# Altium footprint library Connectors THD.PcbLib: 631 footprints (part 31 of 46) (continued)
## PHOENIX_1777222 [mm] "PCB Header, 12A, 320V, Pitch: 5.08mm, 17 Positions, MSTBV Serie"
height 12
pads (19):
  round 2.1 hole 1.4: 1(-40.64,0) 2(-35.56,0) 3(-30.48,0) 4(-25.4,0) 5(-20.32,0) 6(-15.24,0) 7(-10.16,0) 8(-5.08,0) 9(0,0) 10(5.08,0) 11(10.16,0) 12(15.24,0) 13(20.32,0) 14(25.4,0) 15(30.48,0) 16(35.56,0) 17(40.64,0)
  round 3.8 hole 2.4: P1(-45.72,0) P2(45.72,0)
Top Overlay:
  drawing of 314 lines, arcs and shapes, not listed
  text "5" at -20.523,3.505 h0.75
  text "4" at -25.654,3.505 h0.75
  text "3" at -30.709,3.505 h0.75
  text "2" at -35.78,3.505 h0.75
  text "1" at -40.78,3.505 h0.75
  text "6" at -15.443,3.505 h0.75
  text "7" at -10.363,3.505 h0.75
  text "8" at -5.309,3.505 h0.75
  text "9" at -0.203,3.505 h0.75
  text "10" at 4.572,3.505 h0.75
  text "11" at 9.779,3.505 h0.75
  text "12" at 14.707,3.505 h0.75
  text "17" at 40.132,3.505 h0.75
  text "16" at 35.052,3.505 h0.75
  text "15" at 29.972,3.505 h0.75
  text "14" at 24.917,3.505 h0.75
  text "13" at 19.787,3.505 h0.75
Mechanical 8:
  lines w0.1: -46.22,0 -45.72,0 ; -45.72,-0.5 -45.72,0 ; -45.72,0.5 -45.72,0 ; -45.22,0 -45.72,0 ; -41.14,0 -40.64,0 ; -40.64,-0.5 -40.64,0 ; -40.64,0.5 -40.64,0 ; -40.14,0 -40.64,0 ; -36.06,0 -35.56,0 ; -35.56,-0.5 -35.56,0 ; -35.56,0.5 -35.56,0 ; -35.06,0 -35.56,0 ; -30.98,0 -30.48,0 ; -30.48,-0.5 -30.48,0 ; -30.48,0.5 -30.48,0 ; -29.98,0 -30.48,0 ; -25.9,0 -25.4,0 ; -25.4,-0.5 -25.4,0 ; -25.4,0.5 -25.4,0 ; -24.9,0 -25.4,0 ; -20.82,0 -20.32,0 ; -20.32,-0.5 -20.32,0 ; -20.32,0.5 -20.32,0 ; -19.82,0 -20.32,0 ; -15.74,0 -15.24,0 ; -15.24,-0.5 -15.24,0 ; -15.24,0.5 -15.24,0 ; -14.74,0 -15.24,0 ; -13.2,0 -12.7,0 ; -12.7,-0.5 -12.7,0 ; -12.7,0.5 -12.7,0 ; -12.2,0 -12.7,0 ; -10.66,0 -10.16,0 ; -10.16,-0.5 -10.16,0 ; -10.16,0.5 -10.16,0 ; -9.66,0 -10.16,0 ; -5.58,0 -5.08,0 ; -5.08,-0.5 -5.08,0 ; -5.08,0.5 -5.08,0 ; -4.58,0 -5.08,0 ; -0.5,0 0,0 ; 0,-0.5 0,0 ; 0,0.5 0,0 ; 0.5,0 0,0 ; 4.58,0 5.08,0 ; 5.08,-0.5 5.08,0 ; 5.08,0.5 5.08,0 ; 5.58,0 5.08,0 ; 9.66,0 10.16,0 ; 10.16,-0.5 10.16,0 ; 10.16,0.5 10.16,0 ; 10.66,0 10.16,0 ; 14.74,0 15.24,0 ; 15.24,-0.5 15.24,0 ; 15.24,0.5 15.24,0 ; 15.74,0 15.24,0 ; 19.82,0 20.32,0 ; 20.32,-0.5 20.32,0 ; 20.32,0.5 20.32,0 ; 20.82,0 20.32,0 ; 24.9,0 25.4,0 ; 25.4,-0.5 25.4,0 ; 25.4,0.5 25.4,0 ; 25.9,0 25.4,0 ; 29.98,0 30.48,0 ; 30.48,-0.5 30.48,0 ; 30.48,0.5 30.48,0 ; 30.98,0 30.48,0 ; 35.06,0 35.56,0 ; 35.56,-0.5 35.56,0 ; 35.56,0.5 35.56,0 ; 36.06,0 35.56,0 ; 40.14,0 40.64,0 ; 40.64,-0.5 40.64,0 ; 40.64,0.5 40.64,0 ; 41.14,0 40.64,0 ; 45.22,0 45.72,0 ; 45.72,-0.5 45.72,0 ; 45.72,0.5 45.72,0 ; 46.22,0 45.72,0
Mechanical 14:
  drawing of 538 lines, arcs and shapes, not listed
  text "13" at 19.787,3.505 h0.75
  text "14" at 24.917,3.505 h0.75
  text "15" at 29.972,3.505 h0.75
  text "16" at 35.052,3.505 h0.75
  text "17" at 40.132,3.505 h0.75
  text "12" at 14.707,3.505 h0.75
  text "11" at 9.779,3.505 h0.75
  text "10" at 4.572,3.505 h0.75
  text "9" at -0.203,3.505 h0.75
  text "8" at -5.309,3.505 h0.75
  text "7" at -10.363,3.505 h0.75
  text "6" at -15.443,3.505 h0.75
  text "1" at -40.78,3.505 h0.75
  text "2" at -35.78,3.505 h0.75
  text "3" at -30.709,3.505 h0.75
  text "4" at -25.654,3.505 h0.75
  text "5" at -20.523,3.505 h0.75
3D body: height 12, standoff -3.9, extent -48.26,-3.8 48.26,4.8

## PHOENIX_1777251 [mm] "PCB Header, 12A, 320V, Pitch: 5.08mm, 20 Positions, MSTBV Serie"
height 12
pads (22):
  round 2.1 hole 1.4: 1(-48.26,0) 2(-43.18,0) 3(-38.1,0) 4(-33.02,0) 5(-27.94,0) 6(-22.86,0) 7(-17.78,0) 8(-12.7,0) 9(-7.62,0) 10(-2.54,0) 11(2.54,0) 12(7.62,0) 13(12.7,0) 14(17.78,0) 15(22.86,0) 16(27.94,0) 17(33.02,0) 18(38.1,0) 19(43.18,0) 20(48.26,0)
  round 3.8 hole 2.4: P1(-53.34,0) P2(53.34,0)
Top Overlay:
  drawing of 368 lines, arcs and shapes, not listed
  text "20" at 47.701,3.505 h0.75
  text "19" at 42.672,3.505 h0.75
  text "18" at 37.567,3.505 h0.75
  text "5" at -28.143,3.505 h0.75
  text "4" at -33.274,3.505 h0.75
  text "3" at -38.329,3.505 h0.75
  text "2" at -43.4,3.505 h0.75
  text "1" at -48.4,3.505 h0.75
  text "6" at -23.063,3.505 h0.75
  text "7" at -17.983,3.505 h0.75
  text "8" at -12.929,3.505 h0.75
  text "9" at -7.823,3.505 h0.75
  text "10" at -3.048,3.505 h0.75
  text "11" at 2.159,3.505 h0.75
  text "12" at 7.087,3.505 h0.75
  text "17" at 32.512,3.505 h0.75
  text "16" at 27.432,3.505 h0.75
  text "15" at 22.352,3.505 h0.75
  text "14" at 17.297,3.505 h0.75
  text "13" at 12.167,3.505 h0.75
Mechanical 8:
  lines w0.1: -53.84,0 -53.34,0 ; -53.34,-0.5 -53.34,0 ; -53.34,0.5 -53.34,0 ; -52.84,0 -53.34,0 ; -48.76,0 -48.26,0 ; -48.26,-0.5 -48.26,0 ; -48.26,0.5 -48.26,0 ; -47.76,0 -48.26,0 ; -43.68,0 -43.18,0 ; -43.18,-0.5 -43.18,0 ; -43.18,0.5 -43.18,0 ; -42.68,0 -43.18,0 ; -38.6,0 -38.1,0 ; -38.1,-0.5 -38.1,0 ; -38.1,0.5 -38.1,0 ; -37.6,0 -38.1,0 ; -33.52,0 -33.02,0 ; -33.02,-0.5 -33.02,0 ; -33.02,0.5 -33.02,0 ; -32.52,0 -33.02,0 ; -28.44,0 -27.94,0 ; -27.94,-0.5 -27.94,0 ; -27.94,0.5 -27.94,0 ; -27.44,0 -27.94,0 ; -23.36,0 -22.86,0 ; -22.86,-0.5 -22.86,0 ; -22.86,0.5 -22.86,0 ; -22.36,0 -22.86,0 ; -20.82,0 -20.32,0 ; -20.32,-0.5 -20.32,0 ; -20.32,0.5 -20.32,0 ; -19.82,0 -20.32,0 ; -18.28,0 -17.78,0 ; -17.78,-0.5 -17.78,0 ; -17.78,0.5 -17.78,0 ; -17.28,0 -17.78,0 ; -13.2,0 -12.7,0 ; -12.7,-0.5 -12.7,0 ; -12.7,0.5 -12.7,0 ; -12.2,0 -12.7,0 ; -8.12,0 -7.62,0 ; -7.62,-0.5 -7.62,0 ; -7.62,0.5 -7.62,0 ; -7.12,0 -7.62,0 ; -3.04,0 -2.54,0 ; -2.54,-0.5 -2.54,0 ; -2.54,0.5 -2.54,0 ; -2.04,0 -2.54,0 ; 2.04,0 2.54,0 ; 2.54,-0.5 2.54,0 ; 2.54,0.5 2.54,0 ; 3.04,0 2.54,0 ; 7.12,0 7.62,0 ; 7.62,-0.5 7.62,0 ; 7.62,0.5 7.62,0 ; 8.12,0 7.62,0 ; 12.2,0 12.7,0 ; 12.7,-0.5 12.7,0 ; 12.7,0.5 12.7,0 ; 13.2,0 12.7,0 ; 17.28,0 17.78,0 ; 17.78,-0.5 17.78,0 ; 17.78,0.5 17.78,0 ; 18.28,0 17.78,0 ; 22.36,0 22.86,0 ; 22.86,-0.5 22.86,0 ; 22.86,0.5 22.86,0 ; 23.36,0 22.86,0 ; 27.44,0 27.94,0 ; 27.94,-0.5 27.94,0 ; 27.94,0.5 27.94,0 ; 28.44,0 27.94,0 ; 32.52,0 33.02,0 ; 33.02,-0.5 33.02,0 ; 33.02,0.5 33.02,0 ; 33.52,0 33.02,0 ; 37.6,0 38.1,0 ; 38.1,-0.5 38.1,0 ; 38.1,0.5 38.1,0 ; 38.6,0 38.1,0 ; 42.68,0 43.18,0 ; 43.18,-0.5 43.18,0 ; 43.18,0.5 43.18,0 ; 43.68,0 43.18,0 ; 47.76,0 48.26,0 ; 48.26,-0.5 48.26,0 ; 48.26,0.5 48.26,0 ; 48.76,0 48.26,0 ; 52.84,0 53.34,0 ; 53.34,-0.5 53.34,0 ; 53.34,0.5 53.34,0 ; 53.84,0 53.34,0
Mechanical 14:
  drawing of 631 lines, arcs and shapes, not listed
  text "13" at 12.167,3.505 h0.75
  text "14" at 17.297,3.505 h0.75
  text "15" at 22.352,3.505 h0.75
  text "16" at 27.432,3.505 h0.75
  text "17" at 32.512,3.505 h0.75
  text "12" at 7.087,3.505 h0.75
  text "11" at 2.159,3.505 h0.75
  text "10" at -3.048,3.505 h0.75
  text "9" at -7.823,3.505 h0.75
  text "8" at -12.929,3.505 h0.75
  text "7" at -17.983,3.505 h0.75
  text "6" at -23.063,3.505 h0.75
  text "1" at -48.4,3.505 h0.75
  text "2" at -43.4,3.505 h0.75
  text "3" at -38.329,3.505 h0.75
  text "4" at -33.274,3.505 h0.75
  text "5" at -28.143,3.505 h0.75
  text "18" at 37.567,3.505 h0.75
  text "19" at 42.672,3.505 h0.75
  text "20" at 47.701,3.505 h0.75
3D body: height 12, standoff -3.9, extent -55.88,-3.8 55.88,4.8

## PHOENIX_1785968 [mm] "PCB Header, 12A, 320V, Pitch: 5.08mm, 4 Positions, ICV Serie"
height 19
pads (8):
  round 2.1 hole 1.4: 1(-7.62,-2.54) 1(-7.62,2.54) 2(-2.54,-2.54) 2(-2.54,2.54) 3(2.54,-2.54) 3(2.54,2.54) 4(7.62,-2.54) 4(7.62,2.54)
Top Overlay:
  circle w0.2: c-7.62,0.015 r0.7
  circle w0.2: c-2.54,0.015 r0.7
  circle w0.2: c2.54,0.015 r0.7
  circle w0.2: c7.62,0.015 r0.7
  lines w0.2: -11.16,-4.1 -6.68,-4.1 -6.68,-6.3 -5.08,-6.3 -5.08,-4.1 5.08,-4.1 5.08,-6.3 6.68,-6.3 6.68,-4.1 11.16,-4.1 ; -11.16,-2.136 -10.16,-2.5 ; -11.16,2.136 -10.16,2.5 -10.16,-2.9 -9.025,-2.9 ; -10.16,-4.4 -10.16,-4.65 -9.32,-4.65 -9.32,-4.4 ; -10.16,2.015 -9.741,2.015 cw(c-7.62,0.015) -9.07,2.544 ; -8.281,1.249 ccw(c-7.62,0.015) -8.32,1.227 -8.32,-1.197 ccw(c-7.62,0.015) -8.251,-1.235 ; -6.989,-1.235 ccw(c-7.62,0.015) -6.959,1.249 ; -6.92,-4.412 -6.92,-4.65 -6.68,-4.65 ; -6.68,-4.4 -11.16,-4.4 -11.16,3.9 11.16,3.9 11.16,-4.4 6.68,-4.4 ; -6.215,-2.9 -3.945,-2.9 ; -6.17,2.544 cw(c-7.62,0.015) -5.499,2.015 -4.661,2.015 cw(c-2.54,0.015) -3.99,2.544 ; -5.08,-4.65 -4.24,-4.65 -4.24,-4.4 ; -5.08,-4.4 5.08,-4.4 ; -3.201,1.249 ccw(c-2.54,0.015) -3.171,-1.235 ; -1.909,-1.235 ccw(c-2.54,0.015) -1.879,1.249 ; -1.84,-4.4 -1.84,-4.65 0.84,-4.65 0.84,-4.4 ; -1.135,-2.9 1.135,-2.9 ; -1.09,2.544 cw(c-2.54,0.015) -0.419,2.015 0.419,2.015 cw(c2.54,0.015) 1.09,2.544 ; 1.879,1.249 ccw(c2.54,0.015) 1.909,-1.235 ; 3.171,-1.235 ccw(c2.54,0.015) 3.201,1.249 ; 3.24,-4.4 3.24,-4.65 5.08,-4.65 ; 3.945,-2.9 6.215,-2.9 ; 3.99,2.544 cw(c2.54,0.015) 4.661,2.015 5.499,2.015 cw(c7.62,0.015) 6.17,2.544 ; 6.959,1.249 ccw(c7.62,0.015) 6.989,-1.235 ; 8.251,-1.235 ccw(c7.62,0.015) 8.281,1.249 ; 8.32,-4.414 8.32,-4.65 10.16,-4.65 10.16,-4.4 ; 9.025,-2.9 10.16,-2.9 10.16,2.5 11.16,2.136 ; 9.07,2.544 cw(c7.62,0.015) 9.741,2.015 10.16,2.015 ; 10.16,-2.5 11.16,-2.136 ; -5.281,-0.735 -5.08,0.015 -4.879,-0.735 -5.281,-0.735 ; -0.201,-0.735 0,0 0.201,-0.735 -0.201,-0.735 ; 4.879,-0.735 5.08,0.015 5.281,-0.735 4.879,-0.735
  text "4" at 7.266,-6.18 h1
  text "1" at -7.735,-6.18 h1
  text "1" at -9.46,-0.58 h1
Mechanical 8:
  lines w0.1: -8.12,-2.54 -7.62,-2.54 ; -8.12,2.54 -7.62,2.54 ; -7.62,-3.04 -7.62,-2.54 ; -7.62,-2.04 -7.62,-2.54 ; -7.62,2.04 -7.62,2.54 ; -7.62,3.04 -7.62,2.54 ; -7.12,-2.54 -7.62,-2.54 ; -7.12,2.54 -7.62,2.54 ; -3.04,-2.54 -2.54,-2.54 ; -3.04,2.54 -2.54,2.54 ; -2.54,-3.04 -2.54,-2.54 ; -2.54,-2.04 -2.54,-2.54 ; -2.54,2.04 -2.54,2.54 ; -2.54,3.04 -2.54,2.54 ; -2.04,-2.54 -2.54,-2.54 ; -2.04,2.54 -2.54,2.54 ; -0.5,0 0,0 ; 0,-0.5 0,0 ; 0,0.5 0,0 ; 0.5,0 0,0 ; 2.04,-2.54 2.54,-2.54 ; 2.04,2.54 2.54,2.54 ; 2.54,-3.04 2.54,-2.54 ; 2.54,-2.04 2.54,-2.54 ; 2.54,2.04 2.54,2.54 ; 2.54,3.04 2.54,2.54 ; 3.04,-2.54 2.54,-2.54 ; 3.04,2.54 2.54,2.54 ; 7.12,-2.54 7.62,-2.54 ; 7.12,2.54 7.62,2.54 ; 7.62,-3.04 7.62,-2.54 ; 7.62,-2.04 7.62,-2.54 ; 7.62,2.04 7.62,2.54 ; 7.62,3.04 7.62,2.54 ; 8.12,-2.54 7.62,-2.54 ; 8.12,2.54 7.62,2.54
Mechanical 14:
  circle w0.1: c-7.62,0.015 r0.7
  circle w0.1: c-2.54,0.015 r0.7
  circle w0.1: c-2.54,0.015 r1.4
  circle w0.1: c2.54,0.015 r0.7
  circle w0.1: c2.54,0.015 r1.4
  circle w0.1: c7.62,0.015 r0.7
  circle w0.1: c7.62,0.015 r1.4
  lines w0.1: -11.16,-4.1 -6.68,-4.1 -6.68,-6.3 -5.08,-6.3 -5.08,-4.1 5.08,-4.1 5.08,-6.3 6.68,-6.3 6.68,-4.1 11.16,-4.1 ; -11.16,-2.136 -10.16,-2.5 ; -11.16,2.136 -10.16,2.5 -10.16,-2.9 -8.875,-2.9 -9.11,-2.22 -6.13,-2.22 -6.365,-2.9 -3.795,-2.9 -4.03,-2.22 -1.05,-2.22 -1.285,-2.9 1.285,-2.9 1.05,-2.22 4.03,-2.22 3.795,-2.9 6.365,-2.9 6.13,-2.22 9.11,-2.22 8.875,-2.9 10.16,-2.9 10.16,2.5 11.16,2.136 ; -10.16,-4.4 -10.16,-4.65 -9.32,-4.65 -9.32,-4.4 ; -10.16,2.015 -9.741,2.015 cw(c-7.62,0.015) -5.499,2.015 -4.661,2.015 cw(c-2.54,0.015) -0.419,2.015 0.419,2.015 cw(c2.54,0.015) 4.661,2.015 5.499,2.015 cw(c7.62,0.015) 9.741,2.015 10.16,2.015 ; -6.92,-4.412 -6.92,-4.65 -6.68,-4.65 ; -6.68,-4.4 -11.16,-4.4 -11.16,3.9 11.16,3.9 11.16,-4.4 6.68,-4.4 ; -5.08,-4.65 -4.24,-4.65 -4.24,-4.4 ; -5.08,-4.4 5.08,-4.4 ; -1.84,-4.4 -1.84,-4.65 0.84,-4.65 0.84,-4.4 ; 3.24,-4.4 3.24,-4.65 5.08,-4.65 ; 8.32,-4.414 8.32,-4.65 10.16,-4.65 10.16,-4.4 ; 10.16,-2.5 11.16,-2.136 ; -8.32,-1.197 ccw(c-7.62,0.015) -8.32,1.227 -8.32,-1.197 ; -5.281,-0.735 -5.08,0.015 -4.879,-0.735 -5.281,-0.735 ; -0.201,-0.735 0,0 0.201,-0.735 -0.201,-0.735 ; 4.879,-0.735 5.08,0.015 5.281,-0.735 4.879,-0.735
  text "4" at 7.266,-6.18 h1
  text "1" at -7.735,-6.18 h1
  text "1" at -9.46,-0.58 h1
3D body: height 19, standoff -3.6, extent -11.16,-6.3 11.16,3.9

## PHOENIX_1803426 [mm] "PCB Header, 8A, 160 V, Pitch: 3.81mm, 2 Positions, MCV Serie"
height 9.2
pads (2):
  round 1.9 hole 1.2: 1(-1.905,0) 2(1.905,0)
Top Overlay:
  lines w0.2: -4.505,4 4.505,4 ; -3.61,-2.3 -2.805,-2.3 ; -3.61,2 -2.305,2 -2.305,2.47 ccw(c-2.505,2.47) -2.505,2.67 ; -3.608,3.9 -3.609,3.9 ; -3.608,4 -3.609,4 -3.609,3.9 ; -2.305,2.134 -3.61,2.134 -3.61,-2.434 -2.759,-2.434 ; -1.505,2.134 -0.2,2.134 -0.2,-2.434 -1.051,-2.434 ; -1.305,2.67 ccw(c-1.305,2.47) -1.505,2.47 -1.505,2 -0.2,2 ; -0.201,4 -0.2,4 -0.2,3.9 -0.201,3.9 -3.609,3.9 ; -0.2,-2.3 -1.005,-2.3 ; 0.2,-2.3 1.005,-2.3 ; 0.2,2 1.505,2 1.505,2.47 ccw(c1.305,2.47) 1.305,2.67 ; 0.202,3.9 0.201,3.9 ; 0.202,4 0.201,4 0.201,3.9 ; 1.505,2.134 0.2,2.134 0.2,-2.434 1.051,-2.434 ; 2.305,2.134 3.61,2.134 3.61,-2.434 2.759,-2.434 ; 2.505,2.67 ccw(c2.505,2.47) 2.305,2.47 2.305,2 3.61,2 ; 3.609,4 3.61,4 3.61,3.9 3.609,3.9 0.201,3.9 ; 3.61,-2.3 2.805,-2.3 ; -2.805,-2.3 cw(c-1.905,-3.5) -1.005,-2.3 ; -2.805,-2.3 -2.794,-2.334 -2.782,-2.367 ccw(c5.266,0.384) -2.759,-2.434 ; -2.759,-2.434 cw(c-1.905,-3.5) -1.051,-2.434 ; -1.051,-2.434 -1.039,-2.401 -1.028,-2.367 ccw(c-9.737,0.61) -1.005,-2.3 ; 1.005,-2.3 cw(c1.905,-3.5) 2.805,-2.3 ; 1.005,-2.3 1.016,-2.334 1.028,-2.367 ccw(c9.076,0.384) 1.051,-2.434 ; 1.051,-2.434 cw(c1.905,-3.5) 2.759,-2.434 ; 2.759,-2.434 2.771,-2.401 2.782,-2.367 ccw(c-5.927,0.61) 2.805,-2.3 ; -4.505,-3 4.505,-3 4.505,4.25 -4.505,4.25 -4.505,-3 ; -3.395,3.35 -0.415,3.35 -0.65,2.67 -3.16,2.67 -3.395,3.35 ; -0.188,-0.7 0.188,-0.7 0,0 -0.188,-0.7 ; 0.415,3.35 3.395,3.35 3.16,2.67 0.65,2.67 0.415,3.35
  text "1" at -2.18,4.6 h1
  text "2" at 1.63,4.6 h1
Mechanical 8:
  lines w0.1: -2.405,0 -1.905,0 ; -1.905,-0.5 -1.905,0 ; -1.905,0.5 -1.905,0 ; -1.405,0 -1.905,0 ; -0.5,0 0,0 ; 0,-0.5 0,0 ; 0,0.5 0,0 ; 0.5,0 0,0 ; 1.405,0 1.905,0 ; 1.905,-0.5 1.905,0 ; 1.905,0.5 1.905,0 ; 2.405,0 1.905,0
Mechanical 14:
  lines w0.1: -4.505,4 4.505,4 ; -3.61,-2.3 -2.805,-2.3 ; -3.61,2 -2.305,2 -2.305,2.47 ccw(c-2.505,2.47) -2.505,2.67 ; -3.608,3.9 -3.609,3.9 ; -3.608,4 -3.609,4 -3.609,3.9 ; -2.305,2.134 -3.61,2.134 -3.61,-2.434 -2.759,-2.434 ; -1.505,2.134 -0.2,2.134 -0.2,-2.434 -1.051,-2.434 ; -1.305,2.67 ccw(c-1.305,2.47) -1.505,2.47 -1.505,2 -0.2,2 ; -0.201,4 -0.2,4 -0.2,3.9 -0.201,3.9 -3.609,3.9 ; -0.2,-2.3 -1.005,-2.3 ; 0.2,-2.3 1.005,-2.3 ; 0.2,2 1.505,2 1.505,2.47 ccw(c1.305,2.47) 1.305,2.67 ; 0.202,3.9 0.201,3.9 ; 0.202,4 0.201,4 0.201,3.9 ; 1.505,2.134 0.2,2.134 0.2,-2.434 1.051,-2.434 ; 2.305,2.134 3.61,2.134 3.61,-2.434 2.759,-2.434 ; 2.505,2.67 ccw(c2.505,2.47) 2.305,2.47 2.305,2 3.61,2 ; 3.609,4 3.61,4 3.61,3.9 3.609,3.9 0.201,3.9 ; 3.61,-2.3 2.805,-2.3 ; -2.805,-2.3 cw(c-1.905,-3.5) -1.005,-2.3 ; -2.805,-2.3 -2.794,-2.334 -2.782,-2.367 ccw(c5.266,0.384) -2.759,-2.434 ; -2.759,-2.434 cw(c-1.905,-3.5) -1.051,-2.434 ; -1.051,-2.434 -1.039,-2.401 -1.028,-2.367 ccw(c-9.737,0.61) -1.005,-2.3 ; 1.005,-2.3 cw(c1.905,-3.5) 2.805,-2.3 ; 1.005,-2.3 1.016,-2.334 1.028,-2.367 ccw(c9.076,0.384) 1.051,-2.434 ; 1.051,-2.434 cw(c1.905,-3.5) 2.759,-2.434 ; 2.759,-2.434 2.771,-2.401 2.782,-2.367 ccw(c-5.927,0.61) 2.805,-2.3 ; -4.505,-3 4.505,-3 4.505,4.25 -4.505,4.25 -4.505,-3 ; -3.395,3.35 -0.415,3.35 -0.65,2.67 -3.16,2.67 -3.395,3.35 ; -2.405,-0.625 ccw(c-1.905,0) -2.405,0.625 -2.405,-0.624 ; -2.305,-0.4 -2.305,0.4 -1.505,0.4 -1.505,-0.4 -2.305,-0.4 ; -0.188,-0.7 0.188,-0.7 0,0 -0.188,-0.7 ; 0.415,3.35 3.395,3.35 3.16,2.67 0.65,2.67 0.415,3.35 ; 1.405,-0.625 ccw(c1.905,0) 1.405,0.625 1.405,-0.624 ; 1.505,-0.4 1.505,0.4 2.305,0.4 2.305,-0.4 1.505,-0.4
3D body: height 9.2, standoff -3.4, extent -4.505,-3 4.505,4.25

## PHOENIX_1803439 [mm] "PCB Header, 8A, 160 V, Pitch: 3.81mm, 3 Positions, MCV Serie"
height 9.2
pads (3):
  round 1.9 hole 1.2: 1(-3.81,0) 2(0,0) 3(3.81,0)
Top Overlay:
  lines w0.2: -6.41,4 6.41,4 ; -5.515,-2.3 -4.71,-2.3 ; -5.515,2 -4.21,2 -4.21,2.47 ccw(c-4.41,2.47) -4.41,2.67 ; -5.513,3.9 -5.514,3.9 ; -5.513,4 -5.514,4 -5.514,3.9 ; -4.21,2.134 -5.515,2.134 -5.515,-2.434 -4.664,-2.434 ; -3.41,2.134 -2.105,2.134 -2.105,-2.434 -2.956,-2.434 ; -3.21,2.67 ccw(c-3.21,2.47) -3.41,2.47 -3.41,2 -2.105,2 ; -2.106,4 -2.105,4 -2.105,3.9 -2.106,3.9 -5.514,3.9 ; -2.105,-2.3 -2.91,-2.3 ; -1.705,-2.3 -0.9,-2.3 ; -1.705,2 -0.4,2 -0.4,2.47 ccw(c-0.6,2.47) -0.6,2.67 ; -1.703,3.9 -1.704,3.9 ; -1.703,4 -1.704,4 -1.704,3.9 ; -0.4,2.134 -1.705,2.134 -1.705,-2.434 -0.854,-2.434 ; 0.4,2.134 1.705,2.134 1.705,-2.434 0.854,-2.434 ; 0.6,2.67 ccw(c0.6,2.47) 0.4,2.47 0.4,2 1.705,2 ; 1.704,4 1.705,4 1.705,3.9 1.704,3.9 -1.704,3.9 ; 1.705,-2.3 0.9,-2.3 ; 2.105,-2.3 2.91,-2.3 ; 2.105,2 3.41,2 3.41,2.47 ccw(c3.21,2.47) 3.21,2.67 ; 2.107,3.9 2.106,3.9 ; 2.107,4 2.106,4 2.106,3.9 ; 3.41,2.134 2.105,2.134 2.105,-2.434 2.956,-2.434 ; 4.21,2.134 5.515,2.134 5.515,-2.434 4.664,-2.434 ; 4.41,2.67 ccw(c4.41,2.47) 4.21,2.47 4.21,2 5.515,2 ; 5.514,4 5.515,4 5.515,3.9 5.514,3.9 2.106,3.9 ; 5.515,-2.3 4.71,-2.3 ; -4.71,-2.3 cw(c-3.81,-3.5) -2.91,-2.3 ; -4.71,-2.3 -4.699,-2.334 -4.687,-2.367 ccw(c3.361,0.384) -4.664,-2.434 ; -4.664,-2.434 cw(c-3.81,-3.5) -2.956,-2.434 ; -2.956,-2.434 -2.944,-2.401 -2.933,-2.367 ccw(c-11.642,0.61) -2.91,-2.3 ; -0.9,-2.3 cw(c0,-3.5) 0.9,-2.3 ; -0.9,-2.3 -0.889,-2.334 -0.877,-2.367 ccw(c7.171,0.384) -0.854,-2.434 ; -0.854,-2.434 cw(c0,-3.5) 0.854,-2.434 ; 0.854,-2.434 0.866,-2.401 0.877,-2.367 ccw(c-7.832,0.61) 0.9,-2.3 ; 2.91,-2.3 cw(c3.81,-3.5) 4.71,-2.3 ; 2.91,-2.3 2.921,-2.334 2.933,-2.367 ccw(c10.981,0.384) 2.956,-2.434 ; 2.956,-2.434 cw(c3.81,-3.5) 4.664,-2.434 ; 4.664,-2.434 4.676,-2.401 4.687,-2.367 ccw(c-4.022,0.61) 4.71,-2.3 ; -6.41,-3 -6.41,4.25 6.41,4.25 6.41,-3 -6.41,-3 ; -5.3,3.35 -5.065,2.67 -2.555,2.67 -2.32,3.35 -5.3,3.35 ; -2.093,-0.7 -1.905,0 -1.717,-0.7 -2.093,-0.7 ; -1.49,3.35 -1.255,2.67 1.255,2.67 1.49,3.35 -1.49,3.35 ; 1.717,-0.7 1.905,0 2.093,-0.7 1.717,-0.7 ; 2.32,3.35 2.555,2.67 5.065,2.67 5.3,3.35 2.32,3.35
  text "1" at -4.085,4.6 h1
  text "2" at -0.275,4.6 h1
  text "3" at 3.535,4.6 h1
Mechanical 2:
  circle w0.1: c3.81,0 r0.8
  circle w0.1: c0,0 r0.8
Mechanical 8:
  lines w0.1: -4.31,0 -3.81,0 ; -3.81,-0.5 -3.81,0 ; -3.81,0.5 -3.81,0 ; -3.31,0 -3.81,0 ; -0.5,0 0,0 ; 0,-0.5 0,0 ; 0,0.5 0,0 ; 0.5,0 0,0 ; 3.31,0 3.81,0 ; 3.81,-0.5 3.81,0 ; 3.81,0.5 3.81,0 ; 4.31,0 3.81,0
Mechanical 14:
  lines w0.1: -6.41,4 6.41,4 ; -5.515,-2.3 -4.71,-2.3 ; -5.515,2 -4.21,2 -4.21,2.47 ccw(c-4.41,2.47) -4.41,2.67 ; -5.513,3.9 -5.514,3.9 ; -5.513,4 -5.514,4 -5.514,3.9 ; -4.21,2.134 -5.515,2.134 -5.515,-2.434 -4.664,-2.434 ; -3.41,2.134 -2.105,2.134 -2.105,-2.434 -2.956,-2.434 ; -3.21,2.67 ccw(c-3.21,2.47) -3.41,2.47 -3.41,2 -2.105,2 ; -2.106,4 -2.105,4 -2.105,3.9 -2.106,3.9 -5.514,3.9 ; -2.105,-2.3 -2.91,-2.3 ; -1.705,-2.3 -0.9,-2.3 ; -1.705,2 -0.4,2 -0.4,2.47 ccw(c-0.6,2.47) -0.6,2.67 ; -1.703,3.9 -1.704,3.9 ; -1.703,4 -1.704,4 -1.704,3.9 ; -0.4,2.134 -1.705,2.134 -1.705,-2.434 -0.854,-2.434 ; 0.4,2.134 1.705,2.134 1.705,-2.434 0.854,-2.434 ; 0.6,2.67 ccw(c0.6,2.47) 0.4,2.47 0.4,2 1.705,2 ; 1.704,4 1.705,4 1.705,3.9 1.704,3.9 -1.704,3.9 ; 1.705,-2.3 0.9,-2.3 ; 2.105,-2.3 2.91,-2.3 ; 2.105,2 3.41,2 3.41,2.47 ccw(c3.21,2.47) 3.21,2.67 ; 2.107,3.9 2.106,3.9 ; 2.107,4 2.106,4 2.106,3.9 ; 3.41,2.134 2.105,2.134 2.105,-2.434 2.956,-2.434 ; 4.21,2.134 5.515,2.134 5.515,-2.434 4.664,-2.434 ; 4.41,2.67 ccw(c4.41,2.47) 4.21,2.47 4.21,2 5.515,2 ; 5.514,4 5.515,4 5.515,3.9 5.514,3.9 2.106,3.9 ; 5.515,-2.3 4.71,-2.3 ; -4.71,-2.3 cw(c-3.81,-3.5) -2.91,-2.3 ; -4.71,-2.3 -4.699,-2.334 -4.687,-2.367 ccw(c3.361,0.384) -4.664,-2.434 ; -4.664,-2.434 cw(c-3.81,-3.5) -2.956,-2.434 ; -2.956,-2.434 -2.944,-2.401 -2.933,-2.367 ccw(c-11.642,0.61) -2.91,-2.3 ; -0.9,-2.3 cw(c0,-3.5) 0.9,-2.3 ; -0.9,-2.3 -0.889,-2.334 -0.877,-2.367 ccw(c7.171,0.384) -0.854,-2.434 ; -0.854,-2.434 cw(c0,-3.5) 0.854,-2.434 ; 0.854,-2.434 0.866,-2.401 0.877,-2.367 ccw(c-7.832,0.61) 0.9,-2.3 ; 2.91,-2.3 cw(c3.81,-3.5) 4.71,-2.3 ; 2.91,-2.3 2.921,-2.334 2.933,-2.367 ccw(c10.981,0.384) 2.956,-2.434 ; 2.956,-2.434 cw(c3.81,-3.5) 4.664,-2.434 ; 4.664,-2.434 4.676,-2.401 4.687,-2.367 ccw(c-4.022,0.61) 4.71,-2.3 ; -6.41,-3 -6.41,4.25 6.41,4.25 6.41,-3 -6.41,-3 ; -5.3,3.35 -5.065,2.67 -2.555,2.67 -2.32,3.35 -5.3,3.35 ; -4.31,-0.625 ccw(c-3.81,0) -4.31,0.625 -4.31,-0.624 ; -4.21,-0.4 -3.41,-0.4 -3.41,0.4 -4.21,0.4 -4.21,-0.4 ; -2.093,-0.7 -1.905,0 -1.717,-0.7 -2.093,-0.7 ; -1.49,3.35 -1.255,2.67 1.255,2.67 1.49,3.35 -1.49,3.35 ; -0.4,-0.4 0.4,-0.4 0.4,0.4 -0.4,0.4 -0.4,-0.4 ; 1.717,-0.7 1.905,0 2.093,-0.7 1.717,-0.7 ; 2.32,3.35 2.555,2.67 5.065,2.67 5.3,3.35 2.32,3.35 ; 3.41,-0.4 4.21,-0.4 4.21,0.4 3.41,0.4 3.41,-0.4
3D body: height 9.2, standoff -3.4, extent -6.41,-3 6.41,4.25

## PHOENIX_1803442 [mm] "PCB Header, 8A, 160 V, Pitch: 3.81mm, 4 Positions, MCV Serie"
height 9.2
pads (4):
  round 1.9 hole 1.2: 1(-5.715,0) 2(-1.905,0) 3(1.905,0) 4(5.715,0)
Top Overlay:
  lines w0.2: -8.315,3.9 -4.011,3.9 -4.01,3.9 -4.01,4 -4.011,4 ; -8.315,4 8.315,4 ; -7.42,-2.3 -6.615,-2.3 ; -7.42,2 -6.115,2 -6.115,2.47 ccw(c-6.315,2.47) -6.315,2.67 ; -6.115,2.134 -7.42,2.134 -7.42,-2.434 -6.569,-2.434 ; -5.315,2.134 -4.01,2.134 -4.01,-2.434 -4.861,-2.434 ; -5.115,2.67 ccw(c-5.115,2.47) -5.315,2.47 -5.315,2 -4.01,2 ; -4.01,-2.3 -4.815,-2.3 ; -3.61,-2.3 -2.805,-2.3 ; -3.61,2 -2.305,2 -2.305,2.47 ccw(c-2.505,2.47) -2.505,2.67 ; -3.609,4 -3.61,4 -3.61,3.9 -3.609,3.9 -0.201,3.9 -0.2,3.9 -0.2,4 -0.201,4 ; -2.305,2.134 -3.61,2.134 -3.61,-2.434 -2.759,-2.434 ; -1.505,2.134 -0.2,2.134 -0.2,-2.434 -1.051,-2.434 ; -1.305,2.67 ccw(c-1.305,2.47) -1.505,2.47 -1.505,2 -0.2,2 ; -0.2,-2.3 -1.005,-2.3 ; 0.2,-2.3 1.005,-2.3 ; 0.2,2 1.505,2 1.505,2.47 ccw(c1.305,2.47) 1.305,2.67 ; 0.201,4 0.2,4 0.2,3.9 0.201,3.9 3.609,3.9 3.61,3.9 3.61,4 3.609,4 ; 1.505,2.134 0.2,2.134 0.2,-2.434 1.051,-2.434 ; 2.305,2.134 3.61,2.134 3.61,-2.434 2.759,-2.434 ; 2.505,2.67 ccw(c2.505,2.47) 2.305,2.47 2.305,2 3.61,2 ; 3.61,-2.3 2.805,-2.3 ; 4.01,-2.3 4.815,-2.3 ; 4.01,2 5.315,2 5.315,2.47 ccw(c5.115,2.47) 5.115,2.67 ; 4.011,4 4.01,4 4.01,3.9 4.011,3.9 8.315,3.9 ; 5.315,2.134 4.01,2.134 4.01,-2.434 4.861,-2.434 ; 6.115,2.134 7.42,2.134 7.42,-2.434 6.569,-2.434 ; 6.315,2.67 ccw(c6.315,2.47) 6.115,2.47 6.115,2 7.42,2 ; 7.42,-2.3 6.615,-2.3 ; -6.615,-2.3 cw(c-5.715,-3.5) -4.815,-2.3 ; -6.615,-2.3 -6.604,-2.334 -6.592,-2.367 ccw(c1.456,0.384) -6.569,-2.434 ; -6.569,-2.434 cw(c-5.715,-3.5) -4.861,-2.434 ; -4.861,-2.434 -4.849,-2.401 -4.838,-2.367 ccw(c-13.547,0.61) -4.815,-2.3 ; -2.805,-2.3 cw(c-1.905,-3.5) -1.005,-2.3 ; -2.805,-2.3 -2.794,-2.334 -2.782,-2.367 ccw(c5.266,0.384) -2.759,-2.434 ; -2.759,-2.434 cw(c-1.905,-3.5) -1.051,-2.434 ; -1.051,-2.434 -1.039,-2.401 -1.028,-2.367 ccw(c-9.737,0.61) -1.005,-2.3 ; 1.005,-2.3 cw(c1.905,-3.5) 2.805,-2.3 ; 1.005,-2.3 1.016,-2.334 1.028,-2.367 ccw(c9.05,0.375) 1.051,-2.434 ; 1.051,-2.434 cw(c1.905,-3.5) 2.759,-2.434 ; 2.759,-2.434 2.771,-2.401 2.782,-2.367 ccw(c-5.968,0.624) 2.805,-2.3 ; 4.815,-2.3 cw(c5.715,-3.5) 6.615,-2.3 ; 4.815,-2.3 4.826,-2.334 4.838,-2.367 ccw(c12.886,0.384) 4.861,-2.434 ; 4.861,-2.434 cw(c5.715,-3.5) 6.569,-2.434 ; 6.569,-2.434 6.581,-2.401 6.592,-2.367 ccw(c-2.117,0.61) 6.615,-2.3 ; -8.315,-3 8.315,-3 8.315,4.25 -8.315,4.25 -8.315,-3 ; -7.205,3.35 -4.225,3.35 -4.46,2.67 -6.97,2.67 -7.205,3.35 ; -3.998,-0.7 -3.622,-0.7 -3.81,0 -3.998,-0.7 ; -3.395,3.35 -0.415,3.35 -0.65,2.67 -3.16,2.67 -3.395,3.35 ; -0.188,-0.7 0.188,-0.7 0,0 -0.188,-0.7 ; 0.415,3.35 3.395,3.35 3.16,2.67 0.65,2.67 0.415,3.35 ; 3.622,-0.7 3.998,-0.7 3.81,0 3.622,-0.7 ; 4.225,3.35 4.46,2.67 6.97,2.67 7.205,3.35 4.225,3.35
  text "1" at -5.99,4.6 h1
  text "2" at -2.18,4.6 h1
  text "3" at 1.63,4.6 h1
  text "4" at 5.44,4.6 h1
Mechanical 8:
  lines w0.1: -6.215,0 -5.715,0 ; -5.715,-0.5 -5.715,0 ; -5.715,0.5 -5.715,0 ; -5.215,0 -5.715,0 ; -2.405,0 -1.905,0 ; -1.905,-0.5 -1.905,0 ; -1.905,0.5 -1.905,0 ; -1.405,0 -1.905,0 ; -0.5,0 0,0 ; 0,-0.5 0,0 ; 0,0.5 0,0 ; 0.5,0 0,0 ; 1.405,0 1.905,0 ; 1.905,-0.5 1.905,0 ; 1.905,0.5 1.905,0 ; 2.405,0 1.905,0 ; 5.215,0 5.715,0 ; 5.715,-0.5 5.715,0 ; 5.715,0.5 5.715,0 ; 6.215,0 5.715,0
Mechanical 14:
  drawing of 161 lines, arcs and shapes, not listed
3D body: height 9.2, standoff -3.4, extent -8.315,-3 8.315,4.25

## PHOENIX_1803484 [mm] "PCB Header, 8A, 160 V, Pitch: 3.81mm, 8 Positions, MCV Serie"
height 9.2
pads (8):
  round 1.9 hole 1.2: 1(-13.335,0) 2(-9.525,0) 3(-5.715,0) 4(-1.905,0) 5(1.905,0) 6(5.715,0) 7(9.525,0) 8(13.335,0)
Top Overlay:
  drawing of 290 lines, arcs and shapes, not listed
  text "6" at 5.44,4.6 h1
  text "5" at 1.63,4.6 h1
  text "4" at -2.18,4.6 h1
  text "3" at -5.99,4.6 h1
  text "2" at -9.8,4.6 h1
  text "1" at -13.61,4.6 h1
  text "7" at 9.25,4.6 h1
  text "8" at 13.06,4.6 h1
Mechanical 8:
  lines w0.1: -13.835,0 -13.335,0 ; -13.335,-0.5 -13.335,0 ; -13.335,0.5 -13.335,0 ; -12.835,0 -13.335,0 ; -10.025,0 -9.525,0 ; -9.525,-0.5 -9.525,0 ; -9.525,0.5 -9.525,0 ; -9.025,0 -9.525,0 ; -6.215,0 -5.715,0 ; -5.715,-0.5 -5.715,0 ; -5.715,0.5 -5.715,0 ; -5.215,0 -5.715,0 ; -2.405,0 -1.905,0 ; -1.905,-0.5 -1.905,0 ; -1.905,0.5 -1.905,0 ; -1.405,0 -1.905,0 ; -0.5,0 0,0 ; 0,-0.5 0,0 ; 0,0.5 0,0 ; 0.5,0 0,0 ; 1.405,0 1.905,0 ; 1.905,-0.5 1.905,0 ; 1.905,0.5 1.905,0 ; 2.405,0 1.905,0 ; 5.215,0 5.715,0 ; 5.715,-0.5 5.715,0 ; 5.715,0.5 5.715,0 ; 6.215,0 5.715,0 ; 9.025,0 9.525,0 ; 9.525,-0.5 9.525,0 ; 9.525,0.5 9.525,0 ; 10.025,0 9.525,0 ; 12.835,0 13.335,0 ; 13.335,-0.5 13.335,0 ; 13.335,0.5 13.335,0 ; 13.835,0 13.335,0
Mechanical 14:
  drawing of 492 lines, arcs and shapes, not listed
3D body: height 9.2, standoff -3.4, extent -15.935,-3 15.935,4.25

## PHOENIX_1844210 [mm] "PHOENIX MC Serie, Pitch 3.5mm, 8A, 160V, 2 Positions Header"
height 8.1
pads (2):
  round 1.9 hole 1.2: 1(-1.75,0) 2(1.75,0)
Top Overlay:
  lines w0.2: -4.2,-4.8 4.2,-4.8 ; -2.368,1.2 -4.2,1.2 -4.2,-8 4.2,-8 4.2,1.2 2.368,1.2 ; -1.132,1.2 1.132,1.2 ; -0.201,-7.25 0.201,-7.25 0,-8 -0.201,-7.25
  text "2" at 1.433,-2.35 h1
  text "1" at -1.767,-2.35 h1
Mechanical 8:
  lines w0.1: -2.25,0 -1.75,0 ; -1.75,-0.5 -1.75,0 ; -1.75,0.5 -1.75,0 ; -1.25,0 -1.75,0 ; -0.5,0 0,0 ; 0,-0.5 0,0 ; 0,0.5 0,0 ; 0.5,0 0,0 ; 1.25,0 1.75,0 ; 1.75,-0.5 1.75,0 ; 1.75,0.5 1.75,0 ; 2.25,0 1.75,0
Mechanical 14:
  lines w0.1: -4.2,-4.8 4.2,-4.8 ; -4.2,-8 -4.2,1.2 4.2,1.2 4.2,-8 -4.2,-8 ; -0.201,-7.25 0.201,-7.25 0,-8 -0.201,-7.25
3D body: height 7.25, standoff -3.4, extent -4.2,-8 4.2,1.2